# Altium footprint library TarabusLib_KAP.PcbLib: 504 footprints (part 11 of 32)
Each footprint in its own frame and in the unit in brackets; x right, y up, seen from the top. Pads: shape width x height; smd on the part's side, far side on the other; paste and mask are expansions set on the pad; w line width, h text height; cw(c..) or ccw(c..) is an arc to the next point about the centre after c.
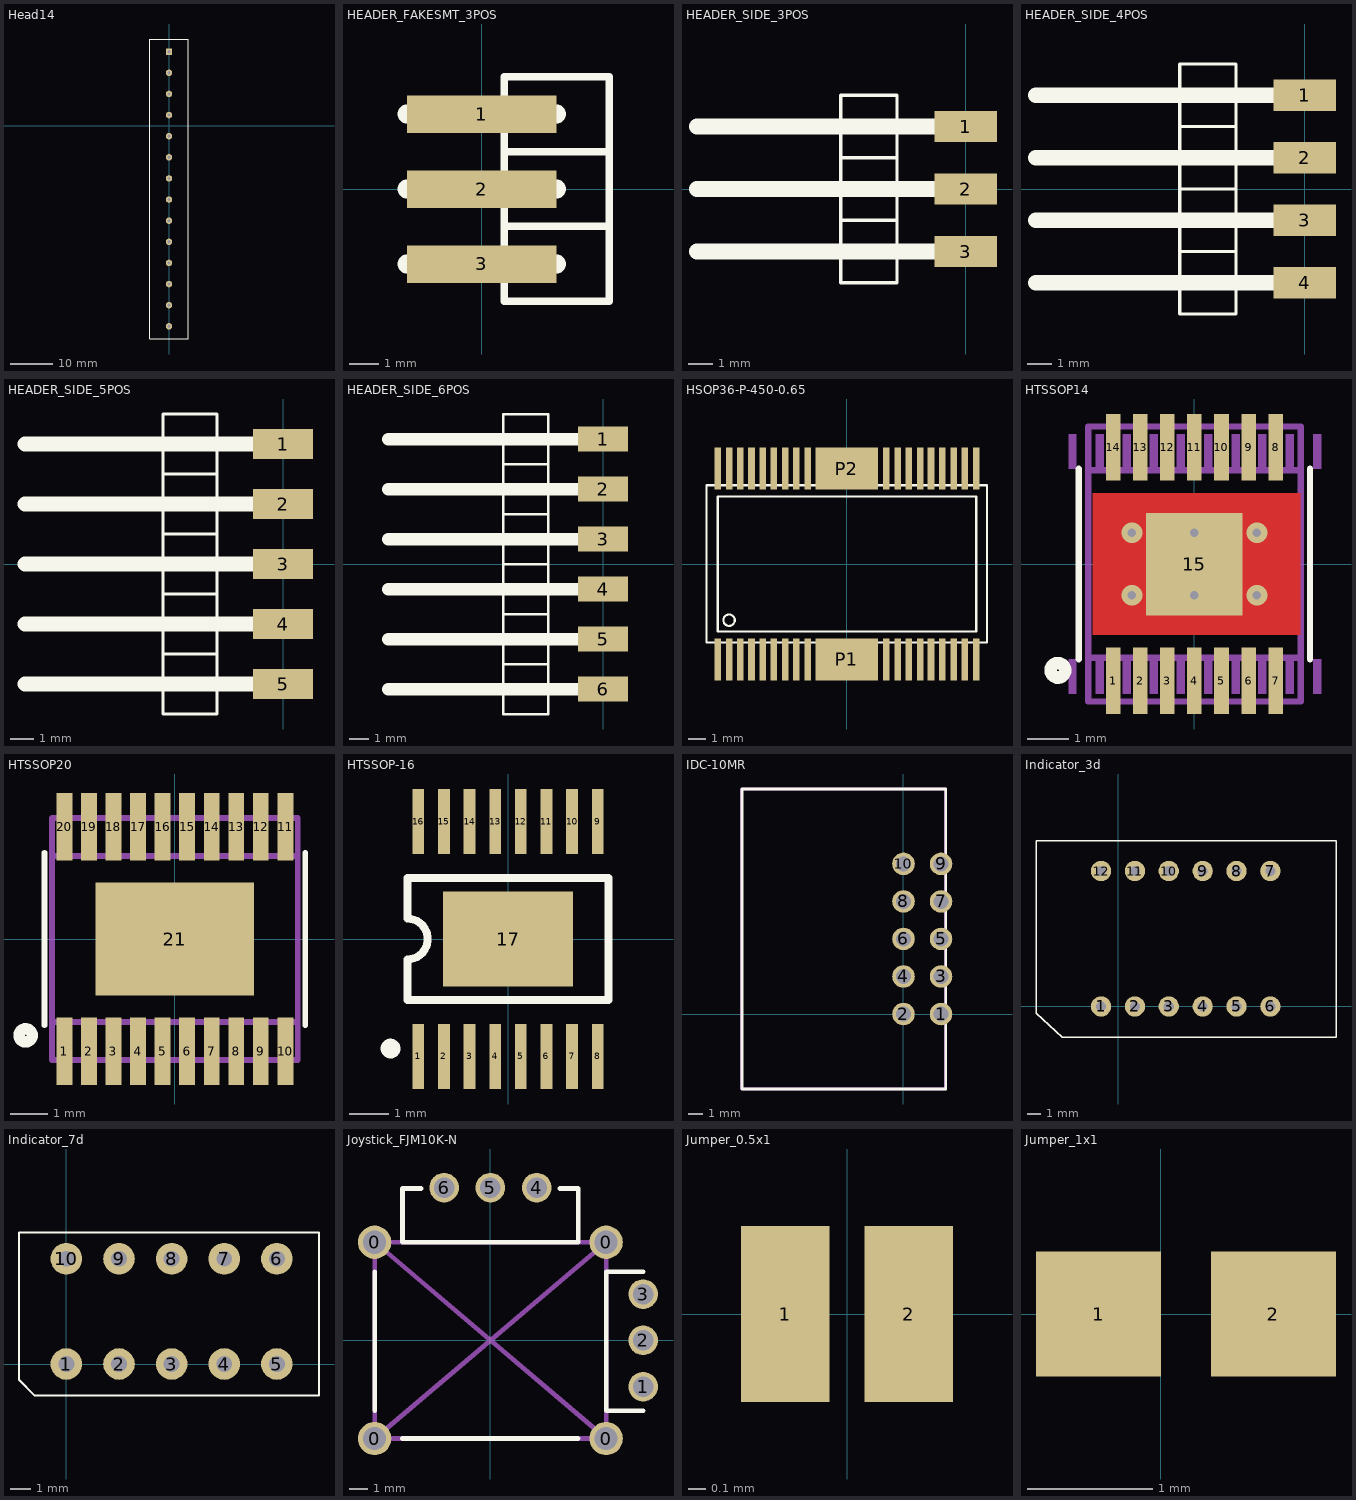
[diagram p10: the footprints below, top view; thin cyan lines are the x and y axes]

## Head14 [mil]
pads (14):
  rect 60x60 hole 30: 1(0,688.98)
  round 60 hole 30: 2(0,492.13) 3(0,295.28) 4(0,98.43) 5(0,-98.43) 6(0,-295.28) 7(0,-492.13) 8(0,-688.98) 9(0,-885.83) 10(0,-1082.68) 11(0,-1279.53) 12(0,-1476.38) 13(0,-1673.23) 14(0,-1870.08)
Top Overlay:
  lines w10: -177.17,-1988.19 177.17,-1988.19 177.17,0 177.17,807.09 -177.17,807.09 -177.17,-708.66 -177.17,-1988.19
3D body: height 610.24, standoff 0, extent -177.17,-1988.19 177.17,807.09

## HEADER_FAKESMT_3POS [mm]
pads (3):
  rect 5.08x1.27 smd: 1(0,2.54) 2(0,0) 3(0,-2.54)
Top Overlay:
  lines w0.254: 0.762,-1.27 4.318,-1.27 ; 0.762,-1.27 0.762,1.27 ; 0.762,-1.27 0.762,-3.81 4.318,-3.81 4.318,-1.27 ; 0.762,1.27 4.318,1.27 ; 0.762,1.27 0.762,3.81 4.318,3.81 4.318,1.27 ; 4.318,-1.27 4.318,1.27
  lines w0.635: -2.54,-2.54 2.54,-2.54 ; -2.54,0 2.54,0 ; -2.54,2.54 2.54,2.54

## HEADER_SIDE_3POS [mm]
pads (3):
  rect 2.54x1.27 smd: 1(0,2.54) 2(0,0) 3(0,-2.54)
Top Overlay:
  lines w0.127: -5.08,-1.27 -5.08,1.27 ; -5.08,-1.27 -5.08,-3.81 -2.794,-3.81 -2.794,-1.27 ; -5.08,-1.27 -2.794,-1.27 ; -5.08,1.27 -5.08,3.81 -2.794,3.81 -2.794,1.27 ; -5.08,1.27 -2.794,1.27 ; -2.794,-1.27 -2.794,1.27
  lines w0.635: -10.922,-2.54 -0.508,-2.54 ; -10.922,0 -0.508,0 ; -10.922,2.54 -0.508,2.54

## HEADER_SIDE_4POS [mm]
pads (4):
  rect 2.54x1.27 smd: 1(0,3.81) 2(0,1.27) 3(0,-1.27) 4(0,-3.81)
Top Overlay:
  lines w0.127: -2.794,-2.54 -5.08,-2.54 ; -5.08,-2.54 -5.08,0 ; -5.08,-2.54 -5.08,-5.08 -2.794,-5.08 -2.794,0 ; -5.08,0 -5.08,2.54 ; -5.08,0 -2.794,0 ; -5.08,2.54 -5.08,5.08 -2.794,5.08 -2.794,2.54 ; -5.08,2.54 -2.794,2.54 ; -2.794,0 -2.794,2.54
  lines w0.635: -10.922,-3.81 -0.508,-3.81 ; -10.922,-1.27 -0.508,-1.27 ; -10.922,1.27 -0.508,1.27 ; -10.922,3.81 -0.508,3.81

## HEADER_SIDE_5POS [mm]
pads (5):
  rect 2.54x1.27 smd: 1(0,5.08) 2(0,2.54) 3(0,0) 4(0,-2.54) 5(0,-5.08)
Top Overlay:
  lines w0.127: -2.794,-3.81 -5.08,-3.81 ; -2.794,-1.27 -5.08,-1.27 ; -5.08,-3.81 -5.08,-1.27 ; -5.08,-3.81 -5.08,-6.35 -2.794,-6.35 -2.794,1.27 ; -5.08,-1.27 -5.08,1.27 ; -5.08,1.27 -5.08,3.81 ; -5.08,1.27 -2.794,1.27 ; -5.08,3.81 -5.08,6.35 -2.794,6.35 -2.794,3.81 ; -5.08,3.81 -2.794,3.81 ; -2.794,1.27 -2.794,3.81
  lines w0.635: -10.922,-5.08 -0.508,-5.08 ; -10.922,-2.54 -0.508,-2.54 ; -10.922,0 -0.508,0 ; -10.922,2.54 -0.508,2.54 ; -10.922,5.08 -0.508,5.08

## HEADER_SIDE_6POS [mm]
pads (6):
  rect 2.54x1.27 smd: 1(0,6.35) 2(0,3.81) 3(0,1.27) 4(0,-1.27) 5(0,-3.81) 6(0,-6.35)
Top Overlay:
  lines w0.127: -5.08,-5.08 -2.794,-5.08 ; -5.08,-5.08 -5.08,-7.62 -2.794,-7.62 -2.794,-5.08 ; -5.08,-5.08 -5.08,-2.54 ; -5.08,-2.54 -2.794,-2.54 ; -5.08,-2.54 -5.08,0 ; -5.08,0 -2.794,0 ; -5.08,0 -2.794,0 ; -5.08,0 -5.08,2.54 ; -5.08,2.54 -2.794,2.54 ; -5.08,2.54 -5.08,5.08 ; -5.08,5.08 -2.794,5.08 ; -5.08,5.08 -5.08,7.62 -2.794,7.62 -2.794,5.08 ; -2.794,-5.08 -2.794,-2.54 ; -2.794,-2.54 -2.794,0 ; -2.794,0 -2.794,2.54 ; -2.794,2.54 -2.794,5.08
  lines w0.635: -10.922,-6.35 -0.508,-6.35 ; -10.922,-3.81 -0.508,-3.81 ; -10.922,-1.27 -0.508,-1.27 ; -10.922,1.27 -0.508,1.27 ; -10.922,3.81 -0.508,3.81 ; -10.922,6.35 -0.508,6.35

## HSOP36-P-450-0.65 [mil]
pads (38):
  rect 15x95 smd: 1(-294.29,-217.52) 2(-268.7,-217.52) 3(-243.11,-217.52) 4(-217.52,-217.52) 5(-191.93,-217.52) 6(-166.34,-217.52) 7(-140.75,-217.52) 8(-115.16,-217.52) 9(-89.57,-217.52) 10(90,-217.52) 11(116,-217.52) 12(141,-217.52) 13(167,-217.52) 14(192,-217.52) 15(218,-217.52) 16(244,-217.52) 17(269,-217.52) 18(295,-217.52) 19(295,218) 20(269,218) 21(244,218) 22(218,218) 23(192,218) 24(167,218) 25(141,218) 26(116,218) 27(90,218) 28(-89.57,218) 29(-115.16,218) 30(-140.75,218) 31(-166.34,218) 32(-191.93,218) 33(-217.52,218) 34(-243.11,218) 35(-268.7,218) 36(-294.29,218)
  rect 142x95 smd: P1(0,-217.52) P2(0,218)
Top Overlay:
  circle w5: c-268.7,-127.95 r13
  lines w5: -319.88,-179.13 -319.88,180 320,180 320,-179.13 -319.88,-179.13 ; -294.29,-153.54 -294.29,154 295,154 295,-153.54 -294.29,-153.54

## HTSSOP14 [mm]
height 1.1
pads (15):
  rect 0.35x1.6 smd mask+0.075: 1(-1.95,-2.8) 2(-1.3,-2.8) 3(-0.65,-2.8) 4(0,-2.8) 5(0.65,-2.8) 6(1.3,-2.8) 7(1.95,-2.8) 8(1.95,2.8) 9(1.3,2.8) 10(0.65,2.8) 11(0,2.8) 12(-0.65,2.8) 13(-1.3,2.8) 14(-1.95,2.8)
  rect 2.31x2.46 smd mask+0.075: 15(0,-0.002)
via 0,0.75 diameter 0.5 hole 0.2
via 0,-0.75 diameter 0.5 hole 0.2
via 1.5,-0.75 diameter 0.5 hole 0.2
via 1.5,0.75 diameter 0.5 hole 0.2
via -1.5,-0.75 diameter 0.5 hole 0.2
via -1.5,0.75 diameter 0.5 hole 0.2
Top Layer:
  rectangle: -2.45,-1.7 2.55,1.7
Top Overlay:
  circle w0.3: c-3.275,-2.552 r0.175
  lines w0.152: -2.775,-2.284 -2.775,2.284 ; 2.775,-2.284 2.775,2.284
Mechanical 7:
  lines w0.152: -2.55,-2.25 2.55,-2.25 ; -2.55,2.25 2.55,2.25 ; -2.55,-3.3 -2.55,3.3 2.55,3.3 2.55,-3.3 -2.55,-3.3
Mechanical 10:
  text ".Comment" at -1.7,4.45 h1.52
  text ".Designator" at -1.85,-5.225 h1.52
Mechanical 16:
  rectangle: -3.027,2.284 -2.823,3.123
  rectangle: -2.377,2.284 -2.173,3.123
  rectangle: -1.727,2.284 -1.523,3.123
  rectangle: -1.077,2.284 -0.873,3.123
  rectangle: -0.427,2.284 -0.223,3.123
  rectangle: 0.229,2.284 0.432,3.123
  rectangle: 0.889,2.284 1.092,3.123
  rectangle: 1.524,2.284 1.727,3.123
  rectangle: 2.184,2.284 2.388,3.123
  rectangle: 2.845,2.284 3.048,3.123
  rectangle: 2.845,-3.123 3.048,-2.284
  rectangle: 2.184,-3.123 2.388,-2.284
  rectangle: 1.524,-3.123 1.727,-2.284
  rectangle: 0.889,-3.123 1.092,-2.284
  rectangle: 0.229,-3.123 0.432,-2.284
  rectangle: -0.427,-3.123 -0.223,-2.284
  rectangle: -1.077,-3.123 -0.873,-2.284
  rectangle: -1.727,-3.123 -1.523,-2.284
  rectangle: -2.377,-3.123 -2.173,-2.284
  rectangle: -3.027,-3.123 -2.823,-2.284
3D body: height 1.1, standoff 0.05, extent -2.55,-2.25 2.55,2.25
3D body: height 0.5, standoff 0.05, extent -2.55,2.2 2.55,3.3
3D body: height 0.5, standoff 0.05, extent -2.55,-3.3 2.55,-2.2

## HTSSOP20 [mm]
height 1.1
pads (21):
  rect 0.42x1.78 smd mask+0.075: 1(-2.925,-2.97) 2(-2.275,-2.97) 3(-1.625,-2.97) 4(-0.975,-2.97) 5(-0.325,-2.97) 6(0.325,-2.97) 7(0.975,-2.97) 8(1.625,-2.97) 9(2.275,-2.97) 10(2.925,-2.97) 11(2.925,2.97) 12(2.275,2.97) 13(1.625,2.97) 14(0.975,2.97) 15(0.325,2.97) 16(-0.325,2.97) 17(-0.975,2.97) 18(-1.625,2.97) 19(-2.275,2.97) 20(-2.925,2.97)
  rect 4.2x3 smd mask+0.075: 21(0,-0.002)
Top Overlay:
  circle w0.3: c-3.95,-2.552 r0.175
  lines w0.152: -3.45,-2.284 -3.45,2.284 ; 3.45,-2.284 3.45,2.284
Mechanical 7:
  lines w0.152: -3.25,-2.2 3.25,-2.2 ; -3.25,2.2 3.25,2.2 ; -3.25,-3.2 -3.25,3.2 3.25,3.2 3.25,-3.2 -3.25,-3.2
Mechanical 10:
  text ".Comment" at -1.7,4.45 h1.52
  text ".Designator" at -1.85,-5.225 h1.52
Mechanical 16:
  rectangle: -3.027,2.284 -2.823,3.123
  rectangle: -2.377,2.284 -2.173,3.123
  rectangle: -1.727,2.284 -1.523,3.123
  rectangle: -1.077,2.284 -0.873,3.123
  rectangle: -0.427,2.284 -0.223,3.123
  rectangle: 0.229,2.284 0.432,3.123
  rectangle: 0.889,2.284 1.092,3.123
  rectangle: 1.524,2.284 1.727,3.123
  rectangle: 2.184,2.284 2.388,3.123
  rectangle: 2.845,2.284 3.048,3.123
  rectangle: 2.845,-3.123 3.048,-2.284
  rectangle: 2.184,-3.123 2.388,-2.284
  rectangle: 1.524,-3.123 1.727,-2.284
  rectangle: 0.889,-3.123 1.092,-2.284
  rectangle: 0.229,-3.123 0.432,-2.284
  rectangle: -0.427,-3.123 -0.223,-2.284
  rectangle: -1.077,-3.123 -0.873,-2.284
  rectangle: -1.727,-3.123 -1.523,-2.284
  rectangle: -2.377,-3.123 -2.173,-2.284
  rectangle: -3.027,-3.123 -2.823,-2.284
3D body: height 1.1, standoff 0.05, extent -3.25,-2.2 3.25,2.2
3D body: height 0.5, standoff 0.05, extent -3.25,2.2 3.25,3.2
3D body: height 0.5, standoff 0.05, extent -3.25,-3.2 3.25,-2.2

## HTSSOP-16 [mm] "Shrink Small Outline; 16 Leads; Body Width 4.4 mm; Pitch 0.65 mm"
height 1.2
pads (17):
  rect 0.3x1.65 smd: 1(-2.275,-2.975) 2(-1.625,-2.975) 3(-0.975,-2.975) 4(-0.325,-2.975) 5(0.325,-2.975) 6(0.975,-2.975) 7(1.625,-2.975) 8(2.275,-2.975) 9(2.275,2.975) 10(1.625,2.975) 11(0.975,2.975) 12(0.325,2.975) 13(-0.325,2.975) 14(-0.975,2.975) 15(-1.625,2.975) 16(-2.275,2.975)
  rect 3.29x2.41 smd: 17(0,0)
Top Overlay:
  circle w0.25: c-2.975,-2.775 r0.125
  lines w0.2: -2.55,-1.55 2.55,-1.55 2.55,1.55 -2.55,1.55 -2.55,0.517 cw(c-2.55,0) -2.55,-0.517 -2.55,-1.55

## IDC-10MR [mil]
pads (10):
  round 60 hole 39.37: 1(100,0) 2(0,0) 3(100,100) 4(0,100) 5(100,200) 6(0,200) 7(100,300) 8(0,300) 9(100,400) 10(0,400)
Top Overlay:
  lines w7.87: -430.71,-199.61 112.6,-199.61 112.6,599.61 -430.71,599.61 -430.71,-199.61
Mechanical 7:
  lines w7.87: -431.1,-199.8 -431.1,599.41 112.2,599.41 112.2,-199.8 -431.1,-199.8
Mechanical 10:
  text ".Designator" at -299.21,629.92 h39.37
  text ".Comment" at -295.28,673.23 h39.37
3D body "header_awhw10a-0502-t.stp": height 350.39, standoff -123.03, extent -440.62,-200.79 117.78,599.21

## Indicator_3d [mil] "Индикатор 3-х разрядный 7-сегментный"
pads (12):
  round 60 hole 30: 1(-50,0) 2(50,0) 3(150,0) 4(250,0) 5(350,0) 6(450,0) 7(450,400) 8(350,400) 9(250,400) 10(150,400) 11(50,400) 12(-50,400)
Top Overlay:
  lines w3.94: -242.13,-19.68 -242.13,-0.39 -242.13,399.61 -242.13,489.37 643.7,489.37 643.7,-0.39 643.7,-90.94 -165.35,-90.55 -242.13,-19.68
3D body "MT30361R индикатор 3х разр. зеленый.STEP": height 283.46, standoff -240.16, extent -244.09,-74.8 641.73,476.38

## Indicator_7d [mil] "7-сегментный одноразрядный индикатор Kingbright"
pads (10):
  round 60 hole 30: 1(0,0) 2(100,0) 3(200,0) 4(300,0) 5(400,0) 6(400,200) 7(300,200) 8(200,200) 9(100,200) 10(0,200)
Top Overlay:
  lines w3.94: -90,-30 -90,30 -90,250 480,250 480,-60 0,-60 -60,-60 -90,-30
  text "." at -90,-60 h60
3D body "9.14mm (0.36INCH) SINGLE DIGIT NUMERIC.STEP": height 334.65, standoff -157.48, extent -74.8,-49.21 476.38,246.06

## Joystick_FJM10K-N [mm]
pads (10):
  round 1.8 hole 1.25: 0(-6.25,-5.311) 0(-6.25,5.289) 0(6.25,-5.311) 0(6.25,5.289)
  round 1.6 hole 1.1: 1(8.25,-2.511) 2(8.25,-0.011) 3(8.25,2.489) 4(2.5,8.239) 5(0,8.239) 6(-2.5,8.239)
Top Overlay:
  lines w0.254: -6.25,-3.811 -6.25,3.689 ; -4.75,-5.311 4.75,-5.311 ; -3.75,8.189 -4.75,8.189 -4.75,5.289 4.75,5.289 4.75,8.189 3.75,8.189 ; 8.25,-3.811 6.25,-3.811 6.25,3.689 8.25,3.689
Mechanical 7:
  lines w0.254: -6.225,5.289 6.25,-5.311 ; -6.25,-5.311 6.25,-5.311 ; -6.25,-5.311 -6.25,5.289 6.25,5.289 ; -6.25,-5.311 6.25,5.289 ; 6.25,-5.311 6.25,5.289
3D body "Основание джостика.STEP": height 18, standoff -3.7, extent -6.775,-6.536 10.275,10.264

## Jumper_0.5x1 [mm]
pads (2):
  rect 0.5x1 smd mask+0.1: 1(-0.35,0) 2(0.35,0)

## Jumper_1x1 [mm] "1x1"
pads (2):
  rect 1x1 smd mask+0.2: 1(-0.5,0) 2(0.9,0)